# Altium footprint library Module.PcbLib: 48 footprints (part 2 of 3)
Each footprint in its own frame and in the unit in brackets; x right, y up, seen from the top. Pads: shape width x height; smd on the part's side, far side on the other; paste and mask are expansions set on the pad; w line width, h text height; cw(c..) or ccw(c..) is an arc to the next point about the centre after c.
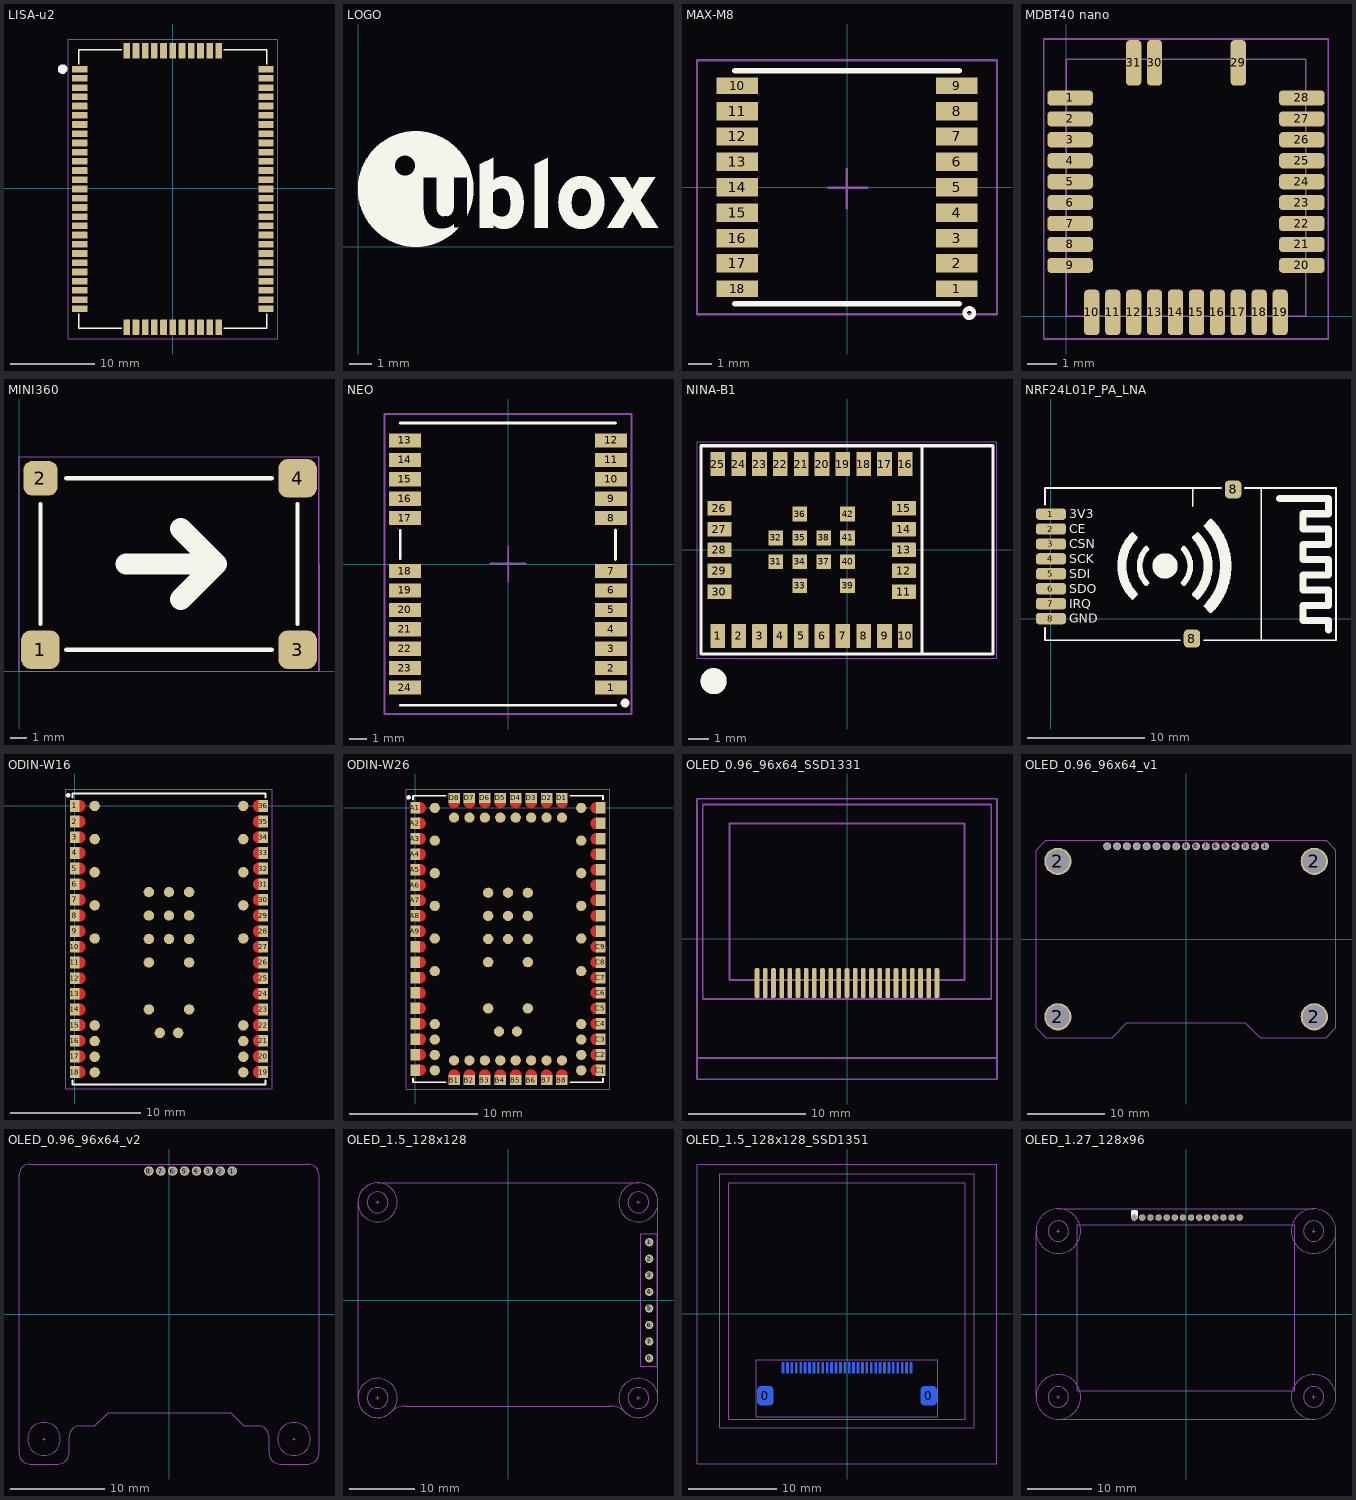
[diagram p1: the footprints below, top view; thin cyan lines are the x and y axes]

## LISA-u2 [mm] "3.75G HSPA+ Cellular Module"
height 2.87
pads (76):
  rrect7% 1.8x0.8 smd paste-10: 1(-11.1,14.2) 2(-11.1,13.1) 3(-11.1,12) 4(-11.1,10.9) 5(-11.1,9.8) 6(-11.1,8.7) 7(-11.1,7.6) 8(-11.1,6.5) 9(-11.1,5.4) 10(-11.1,4.3) 11(-11.1,3.2) 12(-11.1,2.1) 13(-11.1,1) 14(-11.1,-0.1) 15(-11.1,-1.2) 16(-11.1,-2.3) 17(-11.1,-3.4) 18(-11.1,-4.5) 19(-11.1,-5.6) 20(-11.1,-6.7) 21(-11.1,-7.8) 22(-11.1,-8.9) 23(-11.1,-10) 24(-11.1,-11.1) 25(-11.1,-12.2) 26(-11.1,-13.3) 27(-11.1,-14.4) 39(11.1,-14.4) 40(11.1,-13.3) 41(11.1,-12.2) 42(11.1,-11.1) 43(11.1,-10) 44(11.1,-8.9) 45(11.1,-7.8) 46(11.1,-6.7) 47(11.1,-5.6) 48(11.1,-4.5) 49(11.1,-3.4) 50(11.1,-2.3) 51(11.1,-1.2) 52(11.1,-0.1) 53(11.1,1) 54(11.1,2.1) 55(11.1,3.2) 56(11.1,4.3) 57(11.1,5.4) 58(11.1,6.5) 59(11.1,7.6) 60(11.1,8.7) 61(11.1,9.8) 62(11.1,10.9) 63(11.1,12) 64(11.1,13.1) 65(11.1,14.2)
  rrect7% 0.8x1.8 smd paste-10: 28(-5.5,-16.6) 29(-4.4,-16.6) 30(-3.3,-16.6) 31(-2.2,-16.6) 32(-1.1,-16.6) 33(0,-16.6) 34(1.1,-16.6) 35(2.2,-16.6) 36(3.3,-16.6) 37(4.4,-16.6) 38(5.5,-16.6) 66(5.5,16.4) 67(4.4,16.4) 68(3.3,16.4) 69(2.2,16.4) 70(1.1,16.4) 71(0,16.4) 72(-1.1,16.4) 73(-2.2,16.4) 74(-3.3,16.4) 75(-4.4,16.4) 76(-5.5,16.4)
Top Overlay:
  circle w0.635: c-13.154,14.2 r0.254
  lines w0.15: -11.2,-15 -11.2,-16.7 -6.1,-16.7 ; -11.2,14.8 -11.2,16.5 -6.1,16.5 ; 6.1,-16.7 11.2,-16.7 11.2,-15 ; 6.1,16.5 11.2,16.5 11.2,14.8
Top Paste:
  drawing of 152 lines, arcs and shapes, not listed
Mechanical 13:
  text ".Designator" at -12.1,18.3 h1
B-Component:
  lines w0.05: -12.5,-18 -12.5,17.8 12.5,17.8 12.5,-18 -12.5,-18
3D body: height 2.87, standoff 0, extent -11.2,-16.7 11.2,16.5

## LOGO [mm] "u-blox logo"
Top Overlay:
  drawing of 5 lines, arcs and shapes, not listed

## MAX-M8 [mm] "u-blox M8 concurrent GNSS modules"
height 2.7
pads (18):
  rect 1.8x0.7 smd paste-10: 1(4.75,-4.4) 9(4.75,4.4) 10(-4.75,4.4) 18(-4.75,-4.4)
  rect 1.8x0.8 smd paste-10: 2(4.75,-3.3) 3(4.75,-2.2) 4(4.75,-1.1) 5(4.75,0) 6(4.75,1.1) 7(4.75,2.2) 8(4.75,3.3) 11(-4.75,3.3) 12(-4.75,2.2) 13(-4.75,1.1) 14(-4.75,0) 15(-4.75,-1.1) 16(-4.75,-2.2) 17(-4.75,-3.3)
Top Overlay:
  circle w0.2: c5.3,-5.45 r0.2
  lines w0.254: -4.85,-5.05 4.85,-5.05 ; -4.85,5.05 4.85,5.05
Top Paste:
  region: -6.25,4.75 -6.25,4.05 -4.85,4.05 -4.85,4.15 -3.95,4.15 -3.95,4.65 -4.85,4.65 -4.85,4.75
  region: 6.25,4.05 6.25,4.75 4.85,4.75 4.85,4.65 3.95,4.65 3.95,4.15 4.85,4.15 4.85,4.05
  region: 6.25,-4.75 6.25,-4.05 4.85,-4.05 4.85,-4.15 3.95,-4.15 3.95,-4.65 4.85,-4.65 4.85,-4.75
  region: -6.25,-4.05 -6.25,-4.75 -4.85,-4.75 -4.85,-4.65 -3.95,-4.65 -3.95,-4.15 -4.85,-4.15 -4.85,-4.05
  region: -6.25,3.7 -6.25,2.9 -4.85,2.9 -4.85,3 -3.95,3 -3.95,3.6 -4.85,3.6 -4.85,3.7
  region: -6.25,2.6 -6.25,1.8 -4.85,1.8 -4.85,1.9 -3.95,1.9 -3.95,2.5 -4.85,2.5 -4.85,2.6
  region: -6.25,1.5 -6.25,0.7 -4.85,0.7 -4.85,0.8 -3.95,0.8 -3.95,1.4 -4.85,1.4 -4.85,1.5
  region: -6.25,0.4 -6.25,-0.4 -4.85,-0.4 -4.85,-0.3 -3.95,-0.3 -3.95,0.3 -4.85,0.3 -4.85,0.4
  region: -6.25,-0.7 -6.25,-1.5 -4.85,-1.5 -4.85,-1.4 -3.95,-1.4 -3.95,-0.8 -4.85,-0.8 -4.85,-0.7
  region: -6.25,-1.8 -6.25,-2.6 -4.85,-2.6 -4.85,-2.5 -3.95,-2.5 -3.95,-1.9 -4.85,-1.9 -4.85,-1.8
  region: -6.25,-2.9 -6.25,-3.7 -4.85,-3.7 -4.85,-3.6 -3.95,-3.6 -3.95,-3 -4.85,-3 -4.85,-2.9
  region: 6.25,-3.7 6.25,-2.9 4.85,-2.9 4.85,-3 3.95,-3 3.95,-3.6 4.85,-3.6 4.85,-3.7
  region: 6.25,-2.6 6.25,-1.8 4.85,-1.8 4.85,-1.9 3.95,-1.9 3.95,-2.5 4.85,-2.5 4.85,-2.6
  region: 6.25,-1.5 6.25,-0.7 4.85,-0.7 4.85,-0.8 3.95,-0.8 3.95,-1.4 4.85,-1.4 4.85,-1.5
  region: 6.25,-0.4 6.25,0.4 4.85,0.4 4.85,0.3 3.95,0.3 3.95,-0.3 4.85,-0.3 4.85,-0.4
  region: 6.25,0.7 6.25,1.5 4.85,1.5 4.85,1.4 3.95,1.4 3.95,0.8 4.85,0.8 4.85,0.7
  region: 6.25,1.8 6.25,2.6 4.85,2.6 4.85,2.5 3.95,2.5 3.95,1.9 4.85,1.9 4.85,1.8
  region: 6.25,2.9 6.25,3.7 4.85,3.7 4.85,3.6 3.95,3.6 3.95,3 4.85,3 4.85,2.9
Mechanical 13:
  text ".Designator" at -3.942,6.973 h1
B-Component:
  lines w0.1: -0.822,-0.023 -0.007,-0.023 ; -0.007,-0.918 -0.007,-0.023 ; -0.007,0.775 -0.007,-0.023 ; 0.871,-0.023 -0.007,-0.023 ; -6.5,-5.5 -6.5,5.5 6.5,5.5 6.5,-5.5 -6.5,-5.5
3D body: height 2.7, standoff 0, extent -4.851,-5.05 4.849,5.05

## MDBT40 nano [mil]
pads (31):
  rrect50% 60x20 smd: 1(5,287.4) 2(5,259.84) 3(5,232.28) 4(5,204.72) 5(5,177.17) 6(5,149.61) 7(5,122.05) 8(5,94.49) 9(5,66.93) 20(310,66.93) 21(310,94.49) 22(310,122.05) 23(310,149.61) 24(310,177.17) 25(310,204.72) 26(310,232.28) 27(310,259.84) 28(310,287.4)
  rrect50% 20x60 smd: 10(33.46,5) 11(61.02,5) 12(88.58,5) 13(116.14,5) 14(143.7,5) 15(171.26,5) 16(198.82,5) 17(226.38,5) 18(253.94,5) 19(281.5,5) 29(226.38,333.58) 30(116.14,333.58) 31(88.58,333.58)
Mechanical 13:
  lines w2: 0,0 314.96,0 314.96,338.58 0,338.58 0,0
T-Component:
  lines w2: -30,-30 -30,365 345,365 345,-30 -30,-30

## MINI360 [mil]
pads (4):
  rrect50% 90x90 smd: 1(50,50) 3(650,50) 4(650,450)
  rrect50% 80x80 smd: 2(50,450)
Top Overlay:
  lines w10: 50,110 50,390 ; 110,50 590,50 ; 110,450 590,450 ; 650,110 650,390
  lines w50: 250,250 460,250 ; 377.5,167.5 460,250 ; 377.5,332.5 460,250
Mechanical 13:
  lines w2: 0,0 0,500 700,500 700,0 0,0
T-Component:
  lines w2: 0,0 0,500 700,500 700,0 0,0

## NEO [mm] "u-blox NEO GNSS module"
pads (24):
  rect 1.8x0.8 smd paste-0.1: 1(5.842,-7) 2(5.842,-5.9) 3(5.842,-4.8) 4(5.842,-3.7) 5(5.842,-2.6) 6(5.842,-1.5) 7(5.842,-0.4) 8(5.842,2.6) 9(5.842,3.7) 10(5.842,4.8) 11(5.842,5.9) 12(5.842,7) 13(-5.842,7) 14(-5.842,5.9) 15(-5.842,4.8) 16(-5.842,3.7) 17(-5.842,2.6) 18(-5.842,-0.4) 19(-5.842,-1.5) 20(-5.842,-2.6) 21(-5.842,-3.7) 22(-5.842,-4.8) 23(-5.842,-5.9) 24(-5.842,-7)
Top Overlay:
  circle w0.38: c6.636,-7.879 r0.058
  lines w0.16: -6.109,-8 6.096,-8 ; -6.109,7.996 6.09,7.996 ; -6.102,0.299 -6.102,1.893 ; 6.096,0.255 6.096,1.919
Top Paste:
  rectangle: 5.642,-7.4 6.842,-6.6
  rectangle: 5.642,-6.3 6.842,-5.5
  rectangle: 5.642,-5.2 6.842,-4.4
  rectangle: 5.642,-4.1 6.842,-3.3
  rectangle: 5.642,-3 6.842,-2.2
  rectangle: 5.642,-1.9 6.842,-1.1
  rectangle: 5.642,-0.8 6.842,0
  rectangle: 5.642,2.2 6.842,3
  rectangle: 5.642,3.3 6.842,4.1
  rectangle: 5.642,4.4 6.842,5.2
  rectangle: 5.642,5.5 6.842,6.3
  rectangle: 5.642,6.6 6.842,7.4
  rectangle: -6.833,6.6 -5.633,7.4
  rectangle: -6.833,5.5 -5.633,6.3
  rectangle: -6.833,4.4 -5.633,5.2
  rectangle: -6.833,3.3 -5.633,4.1
  rectangle: -6.833,2.2 -5.633,3
  rectangle: -6.833,-0.8 -5.633,0
  rectangle: -6.833,-1.9 -5.633,-1.1
  rectangle: -6.833,-3 -5.633,-2.2
  rectangle: -6.833,-5.2 -5.633,-4.4
  rectangle: -6.833,-6.3 -5.633,-5.5
  rectangle: -6.833,-7.4 -5.633,-6.6
  rectangle: -6.833,-4.1 -5.633,-3.3
Mechanical 13:
  text ".Designator" at -5.585,9.867 h1
B-Component:
  lines w0.1: -1,0.024 0.02,0.024 ; 0.02,-1 0.02,0.024 ; 0.02,1 0.02,0.024 ; 1,0.024 0.02,0.024 ; -7,-8.5 7,-8.5 7,8.5 -7,8.5 -7,-8.5
3D body "NEO (STEP-AP214)_B.STEP": height 2.28, standoff -0.05, extent -6.104,-8 6.096,8

## NINA-B1 [mm] "Stand-alone Bluetooth low energy module"
height 4.14
pads (42):
  rrect10% 0.7x1.15 smd paste+0 mask+0.05: 1(-6.2,-4.125) 2(-5.2,-4.125) 3(-4.2,-4.125) 4(-3.2,-4.125) 5(-2.2,-4.125) 6(-1.2,-4.125) 7(-0.2,-4.125) 8(0.8,-4.125) 9(1.8,-4.125) 10(2.8,-4.125) 16(2.8,4.125) 17(1.8,4.125) 18(0.8,4.125) 19(-0.2,4.125) 20(-1.2,4.125) 21(-2.2,4.125) 22(-3.2,4.125) 23(-4.2,4.125) 24(-5.2,4.125) 25(-6.2,4.125)
  rrect10% 1.15x0.7 smd paste+0 mask+0.05: 11(2.725,-2) 12(2.725,-1) 13(2.725,0) 14(2.725,1) 15(2.725,2) 26(-6.125,2) 27(-6.125,1) 28(-6.125,0) 29(-6.125,-1) 30(-6.125,-2)
  rect 0.7x0.7 smd paste+0 mask+0.05: 31(-3.425,-0.575) 32(-3.425,0.575) 33(-2.275,-1.725) 34(-2.275,-0.575) 35(-2.275,0.575) 36(-2.275,1.725) 37(-1.125,-0.575) 38(-1.125,0.575) 39(0.025,-1.725) 40(0.025,-0.575) 41(0.025,0.575) 42(0.025,1.725)
Top Overlay:
  circle w0.75: c-6.4,-6.3 r0.25
  lines w0.15: 3.6,-5 3.6,5 ; -7,-5 7,-5 7,5 -7,5 -7,-5
Mechanical 13:
  circle w0.75: c-6.4,-6.3 r0.25
  lines w0.1: -7,-5 7,-5 7,5 -7,5 -7,-5
  text ".Designator" at -7,6 h1
B-Component:
  lines w0.05: -7.2,-5.2 7.2,-5.2 7.2,5.2 -7.2,5.2 -7.2,-5.2
3D body: height 4.1, standoff 0, extent 3.6,-5 7,5
3D body: height 2.5, standoff 0.05, extent -7,-5 3.6,5

## NRF24L01P_PA_LNA [mil]
pads (10):
  rrect50% 100x38 smd: 1(0,350) 2(0,300) 3(0,250) 4(0,200) 5(0,150) 6(0,100) 7(0,50) 8(0,0)
  rrect50% 55x60 smd: 8(472.44,-66.93) 8(610.24,432.68)
Top Overlay:
  circle w45: c382,176.4 r20
  lines w6: -20,-31.5 -20,-72.6 433.07,-72.6 ; -20,381.89 -20,437.4 570.87,437.4 ; 474.84,377.4 474.84,437.4 ; 511.81,-72.6 955,-72.6 955,437.4 649.61,437.4 ; 704.92,-72.6 704.92,437.4
  lines w10: 266.5,73.9 273,67.4 287,81.4 282,86.4 ; 267,279.4 273,285.4 287,271.4 282,266.4 ; 314,118.4 319,113.4 325,119.4 320,124.4 ; 314,234.4 319,239.4 325,233.4 320,228.4 ; 444,124.4 439,119.4 445,113.4 450,118.4 ; 444,228.4 439,233.4 445,239.4 450,234.4 ; 482,86.4 477,81.4 491,67.4 497,73.4 ; 482,266.4 477,271.4 491,285.4 497.5,278.9 ; 525.5,51.9 516,42.4 535.5,22.9 545,32.4 ; 526,300.4 516,310.4 535.5,329.9 544.5,320.9
  lines w19: 318.58,120.03 cw(c382,176.4) 318.63,232.84 ; 445.37,119.97 ccw(c382,176.4) 445.42,232.77
  lines w23.62: 765,402.4 929.41,402.4 929.41,351.22 845,351.22 845,300.04 929.41,300.04 929.41,248.86 845,248.86 845,197.68 929.41,197.68 929.41,146.5 845,146.5 845,95.31 929.41,95.31 929.41,44.13 845,44.13 845,-7.05 929.41,-7.05 929.41,-37.6
  lines w30: 272.76,82.2 cw(c382,176.4) 272.76,270.61 ; 491.24,82.2 ccw(c382,176.4) 491.24,270.61
  lines w38: 535.57,42.65 ccw(c382,176.4) 535.57,310.15
  text "GND" at 61,-14.6 h30
  text "IRQ" at 61,35.4 h30
  text "SDO" at 61,85.4 h30
  text "SDI" at 61,135.4 h30
  text "SCK" at 61,185.4 h30
  text "CSN" at 61,235.4 h30
  text "3V3" at 61,335.4 h30
  text "CE" at 61,285.4 h30
T-Component:
  text ".Designator" at 187.01,177.17 h50
3D body "RF.step": height 46.5, standoff -0.8, extent -15,-67.6 950,432.4

## ODIN-W16 [mm] "ODIN-W16 WiFi/BT module"
pads (69):
  rect 0.75x0.9 smd mask+0.05: 1(0,0) 2(0,-1.2) 3(0,-2.4) 4(0,-3.6) 5(0,-4.8) 6(0,-6) 7(0,-7.2) 8(0,-8.4) 9(0,-9.6) 10(0,-10.8) 11(0,-12) 12(0,-13.2) 13(0,-14.4) 14(0,-15.6) 15(0,-16.8) 16(0,-18) 17(0,-19.2) 18(0,-20.4) 19(14.45,-20.4) 20(14.45,-19.2) 21(14.45,-18) 22(14.45,-16.8) 23(14.45,-15.6) 24(14.45,-14.4) 25(14.45,-13.2) 26(14.45,-12) 27(14.45,-10.8) 28(14.45,-9.6) 29(14.45,-8.4) 30(14.45,-7.2) 31(14.45,-6) 32(14.45,-4.8) 33(14.45,-3.6) 34(14.45,-2.4) 35(14.45,-1.2) 36(14.45,0)
  round 0.8 smd mask+0.05: GND(5.685,-15.6) GND(5.685,-12) GND(5.685,-10.2) GND(5.685,-8.4) GND(5.685,-6.6) GND(6.525,-17.4) GND(7.225,-10.2) GND(7.225,-8.4) GND(7.225,-6.6) GND(7.925,-17.4) GND(8.765,-15.6) GND(8.765,-12) GND(8.765,-10.2) GND(8.765,-8.4) GND(8.765,-6.6) GND(12.925,-20.425) GND(12.925,-19.225) GND(12.925,-18.025) GND(12.925,-16.825) NC1(1.525,-20.425) NC2(1.525,-19.225) NC3(1.525,-18.025) NC4(1.525,-16.825) TP1(1.525,-10.16) TP2(12.925,-10.16) TP3(1.525,-7.62) TP4(12.925,-7.62) TP5(1.525,-5.08) TP6(12.925,-5.08) TP7(1.525,-2.54) TP8(12.925,-2.54) TP9(1.525,0) TP10(12.925,0)
Top Layer:
  circle w0.45: c0.375,0 r0.225
  circle w0.45: c0.375,-1.2 r0.225
  circle w0.45: c0.375,-2.4 r0.225
  circle w0.45: c0.375,-3.6 r0.225
  circle w0.45: c0.375,-4.8 r0.225
  circle w0.45: c0.375,-6 r0.225
  circle w0.45: c0.375,-7.2 r0.225
  circle w0.45: c0.375,-8.4 r0.225
  circle w0.45: c0.375,-9.6 r0.225
  circle w0.45: c0.375,-10.8 r0.225
  circle w0.45: c0.375,-12 r0.225
  circle w0.45: c0.375,-13.2 r0.225
  circle w0.45: c0.375,-14.4 r0.225
  circle w0.45: c0.375,-15.6 r0.225
  circle w0.45: c0.375,-16.8 r0.225
  circle w0.45: c0.375,-18 r0.225
  circle w0.45: c0.375,-19.2 r0.225
  circle w0.45: c0.375,-20.4 r0.225
  circle w0.45: c14.1,-20.4 r0.225
  circle w0.45: c14.1,-19.2 r0.225
  circle w0.45: c14.1,-18 r0.225
  circle w0.45: c14.1,-16.8 r0.225
  circle w0.45: c14.1,-15.6 r0.225
  circle w0.45: c14.1,-14.4 r0.225
  circle w0.45: c14.1,-13.2 r0.225
  circle w0.45: c14.1,-10.8 r0.225
  circle w0.45: c14.1,-9.6 r0.225
  circle w0.45: c14.1,-8.4 r0.225
  circle w0.45: c14.1,-7.2 r0.225
  circle w0.45: c14.1,0 r0.225
  circle w0.45: c14.1,-1.2 r0.225
  circle w0.45: c14.1,-2.4 r0.225
  circle w0.45: c14.1,-6 r0.225
  circle w0.45: c14.1,-4.8 r0.225
  circle w0.45: c14.1,-3.6 r0.225
  circle w0.45: c14.1,-12 r0.225
Top Overlay:
  lines w0.15: -0.175,-21.05 -0.175,-21.35 14.625,-21.35 14.625,-21.05 ; -0.175,0.65 -0.175,0.95 14.625,0.95 14.625,0.65
  lines w0.2: -0.434,0.838 ccw(c-0.505,0.817) -0.431,0.81
B-Component:
  lines w0.05: -0.7,-21.7 -0.7,1.3 15.15,1.3 15.15,-21.7 -0.7,-21.7
3D body "ODIN-W160 3D-model.stp": height 3.1, standoff 0.18, extent -0.175,-21.35 14.625,0.95

## ODIN-W26 [mm] "ODIN-W262 WiFi/BT  module"
pads (103):
  rect 0.75x0.9 smd mask+0.05: A1(0,0) A2(0,-1.2) A3(0,-2.4) A4(0,-3.6) A5(0,-4.8) A6(0,-6) A7(0,-7.2) A8(0,-8.4) A9(0,-9.6) A10(0,-10.8) A11(0,-12) A12(0,-13.2) A13(0,-14.4) A14(0,-15.6) A15(0,-16.8) A16(0,-18) A17(0,-19.2) A18(0,-20.4) C1(14.45,-20.4) C2(14.45,-19.2) C3(14.45,-18) C4(14.45,-16.8) C5(14.45,-15.6) C6(14.45,-14.4) C7(14.45,-13.2) C8(14.45,-12) C9(14.45,-10.8) C10(14.45,-9.6) C11(14.45,-8.4) C12(14.45,-7.2) C13(14.45,-6) C14(14.45,-4.8) C15(14.45,-3.6) C16(14.45,-2.4) C17(14.45,-1.2) C18(14.45,0)
  rect 0.9x0.75 smd mask+0.05: B1(3.025,-21.175) B2(4.225,-21.175) B3(5.425,-21.175) B4(6.625,-21.175) B5(7.825,-21.175) B6(9.025,-21.175) B7(10.225,-21.175) B8(11.425,-21.175) D1(11.425,0.775) D2(10.225,0.775) D3(9.025,0.775) D4(7.825,0.775) D5(6.625,0.775) D6(5.425,0.775) D7(4.225,0.775) D8(3.025,0.775)
  round 0.8 smd mask+0.05: GND(1.525,-20.425) GND(1.525,-19.225) GND(1.525,-18.025) GND(1.525,-16.825) GND(3.025,-19.65) GND(3.025,-0.75) GND(4.225,-19.65) GND(4.225,-0.75) GND(5.425,-19.65) GND(5.425,-0.75) GND(5.685,-15.6) GND(5.685,-12) GND(5.685,-10.2) GND(5.685,-8.4) GND(5.685,-6.6) GND(6.525,-17.4) GND(6.625,-19.65) GND(6.625,-0.75) GND(7.225,-10.2) GND(7.225,-8.4) GND(7.225,-6.6) GND(7.825,-19.65) GND(7.825,-0.75) GND(7.925,-17.4) GND(8.765,-15.6) GND(8.765,-12) GND(8.765,-10.2) GND(8.765,-8.4) GND(8.765,-6.6) GND(9.025,-19.65) GND(9.025,-0.75) GND(10.225,-19.65) GND(10.225,-0.75) GND(11.425,-19.65) GND(11.425,-0.75) GND(12.925,-20.425) GND(12.925,-19.225) GND(12.925,-18.025) GND(12.925,-16.825) TP1(1.525,-12.7) TP2(12.925,-12.7) TP3(1.525,-10.16) TP4(12.925,-10.16) TP5(1.525,-7.62) TP6(12.925,-7.62) TP7(1.525,-5.08) TP8(12.925,-5.08) TP9(1.525,-2.54) TP10(12.925,-2.54) TP11(1.525,0) TP12(12.925,0)
Top Layer:
  circle w0.45: c14.1,-12 r0.225
  circle w0.45: c14.1,-3.6 r0.225
  circle w0.45: c14.1,-4.8 r0.225
  circle w0.45: c14.1,-6 r0.225
  circle w0.45: c3.025,0.425 r0.225
  circle w0.45: c4.225,0.425 r0.225
  circle w0.45: c5.425,0.425 r0.225
  circle w0.45: c6.625,0.425 r0.225
  circle w0.45: c7.825,0.425 r0.225
  circle w0.45: c9.025,0.425 r0.225
  circle w0.45: c10.225,0.425 r0.225
  circle w0.45: c11.425,0.425 r0.225
  circle w0.45: c14.1,-2.4 r0.225
  circle w0.45: c14.1,-1.2 r0.225
  circle w0.45: c14.1,0 r0.225
  circle w0.45: c14.1,-7.2 r0.225
  circle w0.45: c14.1,-8.4 r0.225
  circle w0.45: c14.1,-9.6 r0.225
  circle w0.45: c14.1,-10.8 r0.225
  circle w0.45: c14.1,-13.2 r0.225
  circle w0.45: c14.1,-14.4 r0.225
  circle w0.45: c14.1,-15.6 r0.225
  circle w0.45: c14.1,-16.8 r0.225
  circle w0.45: c14.1,-18 r0.225
  circle w0.45: c14.1,-19.2 r0.225
  circle w0.45: c14.1,-20.4 r0.225
  circle w0.45: c11.425,-20.8 r0.225
  circle w0.45: c10.225,-20.8 r0.225
  circle w0.45: c9.025,-20.8 r0.225
  circle w0.45: c7.825,-20.8 r0.225
  circle w0.45: c6.625,-20.8 r0.225
  circle w0.45: c5.425,-20.8 r0.225
  circle w0.45: c4.225,-20.8 r0.225
  circle w0.45: c3.025,-20.8 r0.225
  circle w0.45: c0.375,-20.4 r0.225
  circle w0.45: c0.375,-19.2 r0.225
  circle w0.45: c0.375,-18 r0.225
  circle w0.45: c0.375,-16.8 r0.225
  circle w0.45: c0.375,-15.6 r0.225
  circle w0.45: c0.375,-14.4 r0.225
  circle w0.45: c0.375,-13.2 r0.225
  circle w0.45: c0.375,-12 r0.225
  circle w0.45: c0.375,-10.8 r0.225
  circle w0.45: c0.375,-9.6 r0.225
  circle w0.45: c0.375,-8.4 r0.225
  circle w0.45: c0.375,-7.2 r0.225
  circle w0.45: c0.375,-6 r0.225
  circle w0.45: c0.375,-4.8 r0.225
  circle w0.45: c0.375,-3.6 r0.225
  circle w0.45: c0.375,-2.4 r0.225
  circle w0.45: c0.375,-1.2 r0.225
  circle w0.45: c0.375,0 r0.225
Top Overlay:
  lines w0.15: -0.175,-21.05 -0.175,-21.35 2.375,-21.35 ; -0.175,0.65 -0.175,0.95 2.375,0.95 ; 12.075,-21.35 14.625,-21.35 14.625,-21.05 ; 12.075,0.95 14.625,0.95 14.625,0.65
  lines w0.2: -0.434,0.838 ccw(c-0.505,0.817) -0.431,0.81
B-Component:
  lines w0.05: -0.7,-21.875 15.15,-21.875 15.15,1.475 -0.7,1.475 -0.7,-21.875
3D body "ODIN-W262 Module.stp": height 4.47, standoff -0.02, extent -0.175,-21.35 14.625,0.95

## OLED_0.96_96x64_SSD1331 [mil]
pads (23):
  rrect50% 16x100 smd: 1(303.15,-150) 2(275.59,-150) 3(248.03,-150) 4(220.47,-150) 5(192.91,-150) 6(165.35,-150) 7(137.8,-150) 8(110.24,-150) 9(82.68,-150) 10(55.12,-150) 11(27.56,-150) 12(0,-150) 13(-27.56,-150) 14(-55.12,-150) 15(-82.68,-150) 16(-110.24,-150) 17(-137.8,-150) 18(-165.35,-150) 19(-192.91,-150) 20(-220.47,-150) 21(-248.03,-150) 22(-275.59,-150) 23(-303.15,-150)
Mechanical 13:
  lines w6: -505.91,-402.4 505.91,-402.4 ; -505.91,-402.4 -505.91,471.61 505.91,471.61 505.91,-402.4 ; -505.91,-402.4 -505.91,-474.45 505.91,-474.45 505.91,-402.4 ; -486.22,-203.58 486.22,-203.58 486.22,451.93 -486.22,451.93 -486.22,-203.58 ; -396.46,-140 -396.46,388.35 396.46,388.35 396.46,-140 -396.46,-140
3D body "User Library-096OLED.STEP": height 24.42, standoff -126.58, extent -525.58,-398.28 525.6,476.38

## OLED_0.96_96x64_v1 [mil]
pads (21):
  round 40 hole 30: 1(400.45,469.72) 2(350.45,469.72) 3(300.45,469.72) 4(250.45,469.72) 5(200.45,469.72) 6(150.45,469.72) 7(100.45,469.72) 8(50.45,469.72) 9(0.45,469.72) 10(-49.55,469.72) 11(-99.55,469.72) 12(-149.55,469.72) 13(-199.55,469.72) 14(-249.55,469.73) 15(-299.55,469.73) 16(-349.55,469.73) 17(-399.55,469.73)
  round 137.8 hole 118.11 mask+0: 2(-649.15,-393.98) 2(-649.15,393.43) 2(650.06,-393.98) 2(650.06,393.43)
Mechanical 13:
  lines w2: -760,-449.82 -710,-499.82 -374.09,-499.82 -299.55,-425.27 300.45,-425.27 375,-499.82 710,-499.82 760,-449.82 760,450.18 710,500.18 -710,500.18 -760,450.18 -760,-449.82

## OLED_0.96_96x64_v2 [mil]
pads (8):
  round 40 hole 30: 1(265.45,600.55) 2(215.45,600.55) 3(165.45,600.55) 4(115.45,600.55) 5(65.45,600.55) 6(15.45,600.55) 7(-34.55,600.55) 8(-84.55,600.55)
Mechanical 13:
  circle w2: c525,-525 r69
  circle w2: c-525,-525 r69
  lines w2: -530,-525 -520,-525 ; -525,-530 -525,-520 ; 520,-525 530,-525 ; 525,-530 525,-520 ; -630,-585 ccw(c-585,-585) -585,-630 -465,-630 ccw(c-465,-585) -420,-585 -420,-515 cw(c-375,-515) -375,-470 -310.91,-470 -255.45,-414.55 259.55,-414.55 315,-470 375,-470 cw(c375,-515) 420,-515 420,-585 ccw(c465,-585) 465,-630 585,-630 ccw(c585,-585) 630,-585 630,585 ccw(c585,585) 585,630 -585,630 ccw(c-585,585) -630,585 -630,-585
3D body "female_header_a-bl127-eg-z08d.stp": height 133.86, standoff -94.49, extent -117.43,565.11 298.32,635.98

## OLED_1.5_128x128 [mil]
pads (8):
  round 50 hole 32: 1(852.4,350) 2(852.4,250) 3(852.4,150) 4(852.4,50) 5(852.4,-50) 6(852.4,-150) 7(852.4,-250) 8(852.4,-350)
Mechanical 13:
  circle w2: c787.4,-590.55 r118.11
  circle w2: c787.4,-590.55 r63
  circle w2: c-787.4,-590.55 r118.11
  circle w2: c-787.4,-590.55 r63
  circle w2: c-787.4,590.55 r118.11
  circle w2: c-787.4,590.55 r63
  circle w2: c787.4,590.55 r118.11
  circle w2: c787.4,590.55 r63
  lines w2: -797.4,-590.55 -777.4,-590.55 ; -797.4,590.55 -777.4,590.55 ; -787.4,-600.55 -787.4,-580.55 ; -787.4,580.55 -787.4,600.55 ; 777.4,-590.55 797.4,-590.55 ; 777.4,590.55 797.4,590.55 ; 787.4,-600.55 787.4,-580.55 ; 787.4,580.55 787.4,600.55 ; -905.51,-590.55 ccw(c-787.4,-590.55) -787.4,-708.66 ccw(c-787.4,-590.55) -703.89,-674.07 cw(c-620.37,-757.58) -620.37,-639.47 620.37,-639.47 ; -905.51,-590.55 ccw(c-905.51,-590.55) -905.51,-590.55 ; -905.51,-590.55 -905.51,590.55 cw(c-787.4,590.55) -787.4,708.66 787.4,708.66 cw(c787.4,590.55) 905.51,590.55 ; 620.37,-639.47 cw(c620.37,-757.58) 703.89,-674.07 ccw(c787.4,-590.55) 787.4,-708.66 ccw(c787.4,-590.55) 905.51,-590.55 905.51,590.55 ; 620.37,-639.47 620.37,-639.47 ; 905.51,590.55 ccw(c905.51,590.55) 905.51,590.55 ; 802.4,-400 902.4,-400 902.4,400 802.4,400 802.4,-400
T-Component:
  lines w2: 802.4,-400 802.4,400 902.4,400 902.4,-400 802.4,-400
3D body "female_header_a-bl254-eg-g08d.stp": height 334.65, standoff -125.98, extent 803.19,-404.84 901.62,405
3D body "QCopterRCsE_OLED_Pcb.step": height -138.58, standoff -579.53, extent -905.51,-708.67 905.51,708.66

## OLED_1.5_128x128_SSD1351 [mil]
pads (32):
  rrect50% 72x86 smd far side: 0(-364.06,-364.37) 0(364.05,-364.37)
  rrect50% 10x50 smd far side: 1(-285.43,-240.39) 2(-265.75,-240.39) 3(-246.06,-240.39) 4(-226.38,-240.39) 5(-206.69,-240.39) 6(-187.01,-240.39) 7(-167.32,-240.39) 8(-147.64,-240.39) 9(-127.95,-240.39) 10(-108.27,-240.39) 11(-88.58,-240.39) 12(-68.9,-240.39) 13(-49.21,-240.39) 14(-29.53,-240.39) 15(-9.84,-240.39) 16(9.84,-240.39) 17(29.53,-240.39) 18(49.21,-240.39) 19(68.9,-240.39) 20(88.58,-240.39) 21(108.27,-240.39) 22(127.95,-240.39) 23(147.64,-240.39) 24(167.32,-240.39) 25(187.01,-240.39) 26(206.69,-240.39) 27(226.38,-240.39) 28(246.06,-240.39) 29(265.75,-240.39) 30(285.43,-240.39)
Bottom Overlay:
  lines w10: -364.06,-419.37 -364.06,-454.37 364.05,-454.37 364.05,-419.37 ; -364.06,-309.37 -364.06,-254.37 -304.06,-254.37 ; 304.05,-254.37 364.05,-254.37 364.05,-309.37
Mechanical 13:
  lines w2: -669.29,-669.29 669.29,-669.29 669.29,669.29 -669.29,669.29 -669.29,-669.29 ; -566.93,-507.87 566.93,-507.87 566.93,625.98 -566.93,625.98 -566.93,-507.87 ; -527.56,-468.5 -527.56,586.61 527.56,586.61 527.56,-468.5 -527.56,-468.5
T-Component:
  lines w2: -404.06,-459.37 -404.06,-204.37 404.05,-204.37 404.05,-459.37 -404.06,-459.37
3D body: height 62.99, standoff 23.62, extent -527.56,-468.5 527.56,586.61
3D body: height 39.37, standoff 0, extent -669.29,-669.29 669.29,669.29

## OLED_1.27_128x96 [mil]
pads (14):
  round 40 hole 30: 1(-319.09,594.69) 2(-269.09,594.69) 3(-219.09,594.69) 4(-169.09,594.69) 5(-119.09,594.69) 6(-69.09,594.69) 7(-19.09,594.69) 8(30.91,594.69) 9(80.91,594.69) 10(130.91,594.69) 11(180.91,594.69) 12(230.91,594.69) 13(280.91,594.69) 14(330.91,594.69)
Top Overlay:
  region: -299.09,634.69 -299.09,594.69 -304.09,594.69 -304.38,597.61 -306.62,603.02 -310.76,607.16 -316.17,609.4 -319.09,609.69 -322.02,609.4 -327.43,607.16 -331.57,603.02 -333.81,597.61 -334.09,594.69 -339.1,594.69 -339.1,634.68 -334.09,639.69 -304.09,639.69
Bottom Overlay:
  region: -299.09,634.69 -299.09,594.69 -304.09,594.69 -304.38,597.61 -306.62,603.02 -310.76,607.16 -316.17,609.4 -319.09,609.68 -319.09,609.69 -322.02,609.4 -327.43,607.16 -331.57,603.02 -333.81,597.61 -334.09,594.69 -339.1,594.69 -339.1,634.68 -334.09,639.69 -304.09,639.69
Mechanical 13:
  circle w2: c-787.4,-511.81 r63
  circle w2: c787.4,-511.81 r63
  circle w2: c787.4,511.81 r63
  circle w2: c-787.4,511.81 r63
  circle w2: c-787.4,511.81 r137.8
  circle w2: c-787.4,-511.81 r137.8
  circle w2: c787.4,-511.81 r137.8
  circle w2: c787.4,511.81 r137.8
  lines w2: -797.4,-511.81 -777.4,-511.81 ; -797.4,511.81 -777.4,511.81 ; -787.4,-649.61 cw(c-787.4,-511.81) -925.2,-511.81 ; -787.4,-521.81 -787.4,-501.81 ; -787.4,501.81 -787.4,521.81 ; -787.32,-649.61 787.4,-649.61 ccw(c787.4,-511.81) 925.2,-511.81 925.2,511.81 ccw(c787.4,511.81) 787.4,649.61 -787.4,649.61 ccw(c-787.4,511.81) -925.2,511.81 -925.2,-511.81 ; 777.4,-511.81 797.4,-511.81 ; 777.4,511.81 797.4,511.81 ; 787.4,-521.81 787.4,-501.81 ; 787.4,501.81 787.4,521.81 ; -925.2,-511.81 -925.2,-511.81 ; -669.29,-472.44 -669.29,551.18 669.29,551.18 669.29,-472.44 -669.29,-472.44